# Altium footprint library Reflow3D1411sep.PcbLib: 657 footprints (part 41 of 42)
Each footprint in its own frame and in the unit in brackets; x right, y up, seen from the top. Pads: shape width x height; smd on the part's side, far side on the other; paste and mask are expansions set on the pad; w line width, h text height; cw(c..) or ccw(c..) is an arc to the next point about the centre after c.
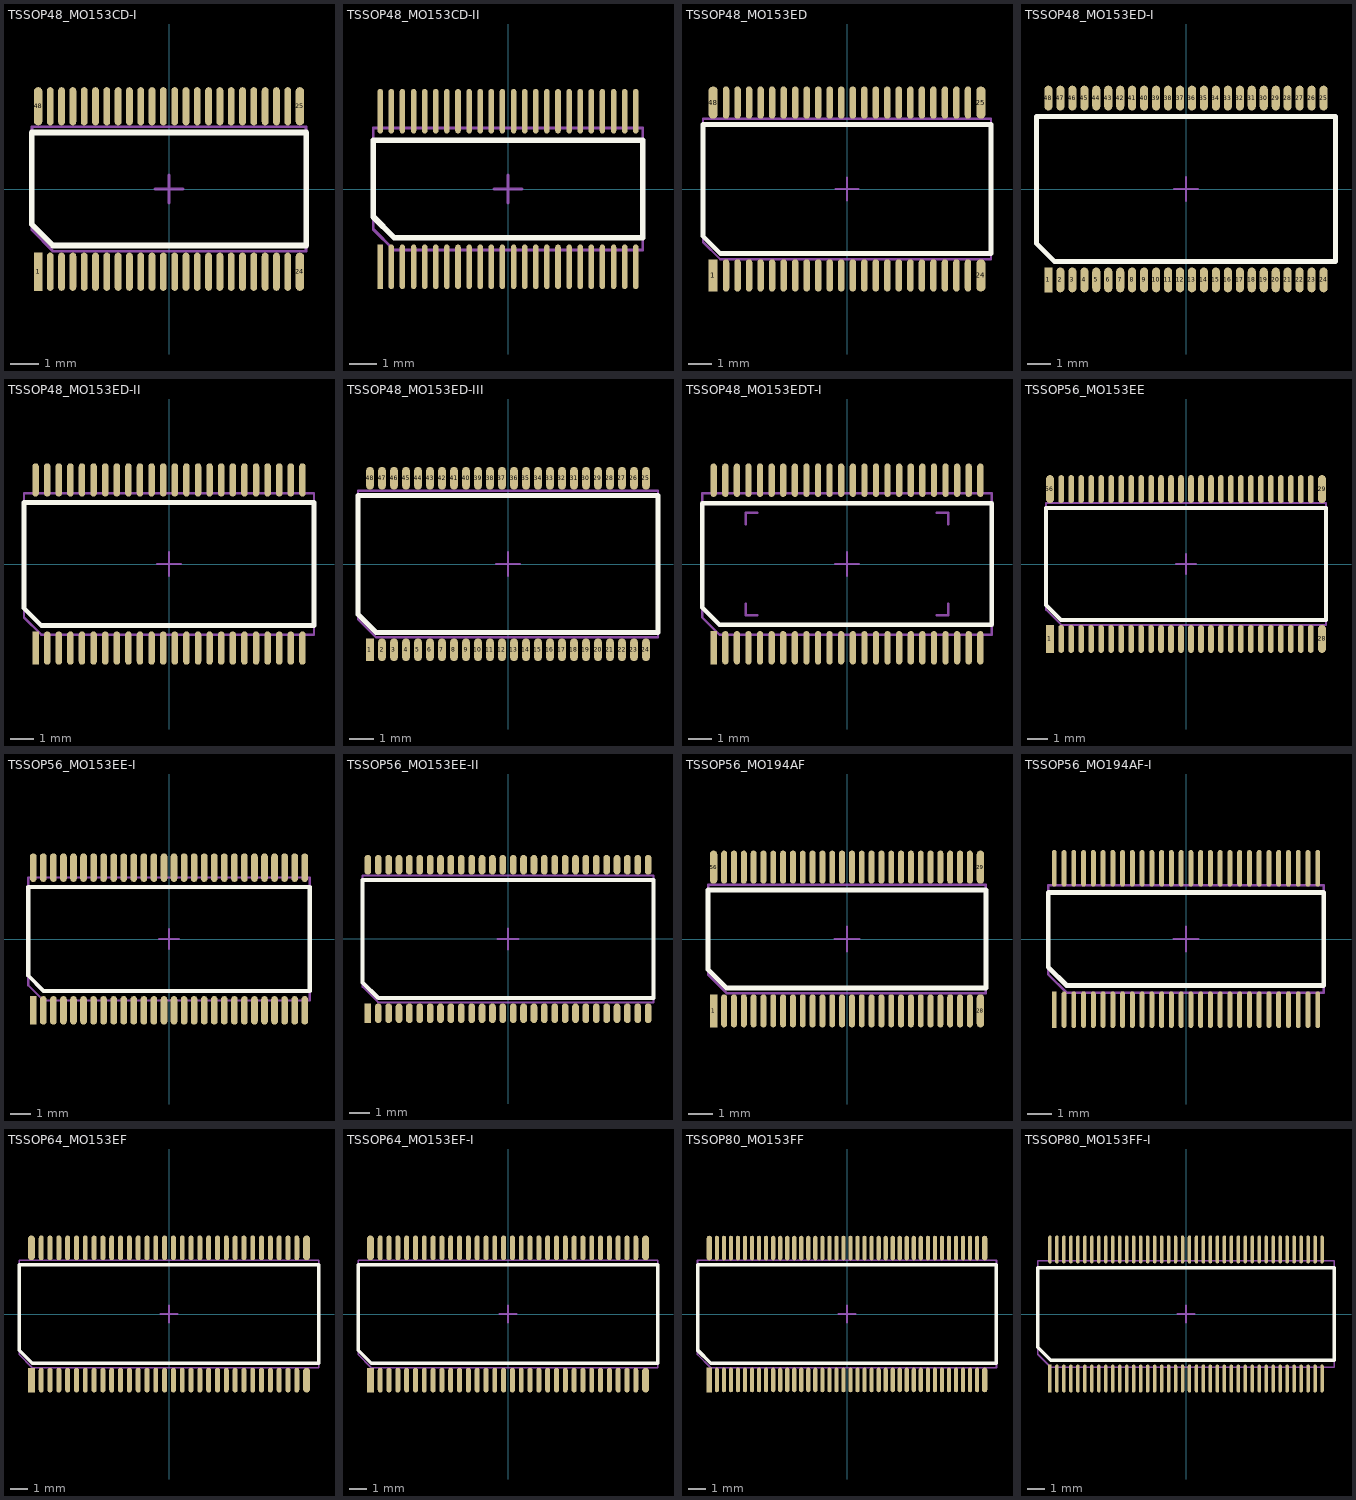
[diagram p40: the footprints below, top view; thin cyan lines are the x and y axes]

## TSSOP48_MO153CD-I [mm] "www.cypress.com, 51-85145.pdf; www.nxp.com, sot480-1_fr.pdf; www.jedec.org, MO-153f.pdf"
height 1.1
pads (48):
  rect 0.3x1.35 smd mask+0.085: 1(-4.63,-2.925)
  oval 0.24x1.35 smd mask+0.085: 2(-4.2,-2.925) 3(-3.8,-2.925) 4(-3.4,-2.925) 5(-3,-2.925) 6(-2.6,-2.925) 7(-2.2,-2.925) 8(-1.8,-2.925) 9(-1.4,-2.925) 10(-1,-2.925) 11(-0.6,-2.925) 12(-0.2,-2.925) 13(0.2,-2.925) 14(0.6,-2.925) 15(1,-2.925) 16(1.4,-2.925) 17(1.8,-2.925) 18(2.2,-2.925) 19(2.6,-2.925) 20(3,-2.925) 21(3.4,-2.925) 22(3.8,-2.925) 23(4.2,-2.925) 26(4.2,2.925) 27(3.8,2.925) 28(3.4,2.925) 29(3,2.925) 30(2.6,2.925) 31(2.2,2.925) 32(1.8,2.925) 33(1.4,2.925) 34(1,2.925) 35(0.6,2.925) 36(0.2,2.925) 37(-0.2,2.925) 38(-0.6,2.925) 39(-1,2.925) 40(-1.4,2.925) 41(-1.8,2.925) 42(-2.2,2.925) 43(-2.6,2.925) 44(-3,2.925) 45(-3.4,2.925) 46(-3.8,2.925) 47(-4.2,2.925)
  oval 0.3x1.35 smd mask+0.085: 24(4.63,-2.925) 25(4.63,2.925) 48(-4.63,2.925)
Top Overlay:
  lines w0.2: -4.85,-1.25 -4.85,2 4.85,2 4.85,-2 -4.1,-2 -4.85,-1.25
Mechanical 13:
  lines w0.1: -4.85,-1.45 -4.85,2.2 4.85,2.2 4.85,-2.2 -4.1,-2.2 -4.85,-1.45
Mechanical 15:
  lines w0.1: -0.5,0 0.5,0 ; 0,-0.5 0,0.5
3D body: height 1.2, standoff 0, extent -4.9,-2.25 4.9,2.25

## TSSOP48_MO153CD-II [mm] "www.ti.com, mpds006c.pdf, DGV48.asc"
height 1.1
pads (48):
  rect 0.2x1.6 smd mask+0.05: 1(-4.6,-2.8)
  oval 0.2x1.6 smd mask+0.05: 2(-4.2,-2.8) 3(-3.8,-2.8) 4(-3.4,-2.8) 5(-3,-2.8) 6(-2.6,-2.8) 7(-2.2,-2.8) 8(-1.8,-2.8) 9(-1.4,-2.8) 10(-1,-2.8) 11(-0.6,-2.8) 12(-0.2,-2.8) 13(0.2,-2.8) 14(0.6,-2.8) 15(1,-2.8) 16(1.4,-2.8) 17(1.8,-2.8) 18(2.2,-2.8) 19(2.6,-2.8) 20(3,-2.8) 21(3.4,-2.8) 22(3.8,-2.8) 23(4.2,-2.8) 24(4.6,-2.8) 25(4.6,2.8) 26(4.2,2.8) 27(3.8,2.8) 28(3.4,2.8) 29(3,2.8) 30(2.6,2.8) 31(2.2,2.8) 32(1.8,2.8) 33(1.4,2.8) 34(1,2.8) 35(0.6,2.8) 36(0.2,2.8) 37(-0.2,2.8) 38(-0.6,2.8) 39(-1,2.8) 40(-1.4,2.8) 41(-1.8,2.8) 42(-2.2,2.8) 43(-2.6,2.8) 44(-3,2.8) 45(-3.4,2.8) 46(-3.8,2.8) 47(-4.2,2.8) 48(-4.6,2.8)
Top Overlay:
  lines w0.2: -4.85,-1 -4.85,1.75 4.85,1.75 4.85,-1.75 -4.1,-1.75 -4.85,-1
Mechanical 13:
  lines w0.1: -4.85,-1.45 -4.85,2.2 4.85,2.2 4.85,-2.2 -4.1,-2.2 -4.85,-1.45
Mechanical 15:
  lines w0.1: -0.5,0 0.5,0 ; 0,-0.5 0,0.5
3D body: height 1.2, standoff 0, extent -4.9,-2.25 4.9,2.25

## TSSOP48_MO153ED [mm] "www.nxp.com, sot362-1_po.pdf, sot362-1_fr.pdf"
height 1.05
pads (48):
  rect 0.4x1.4 smd mask+0.05: 1(-5.81,-3.75)
  oval 0.28x1.4 smd mask+0.05: 2(-5.25,-3.75) 3(-4.75,-3.75) 4(-4.25,-3.75) 5(-3.75,-3.75) 6(-3.25,-3.75) 7(-2.75,-3.75) 8(-2.25,-3.75) 9(-1.75,-3.75) 10(-1.25,-3.75) 11(-0.75,-3.75) 12(-0.25,-3.75) 13(0.25,-3.75) 14(0.75,-3.75) 15(1.25,-3.75) 16(1.75,-3.75) 17(2.25,-3.75) 18(2.75,-3.75) 19(3.25,-3.75) 20(3.75,-3.75) 21(4.25,-3.75) 22(4.75,-3.75) 23(5.25,-3.75) 26(5.25,3.75) 27(4.75,3.75) 28(4.25,3.75) 29(3.75,3.75) 30(3.25,3.75) 31(2.75,3.75) 32(2.25,3.75) 33(1.75,3.75) 34(1.25,3.75) 35(0.75,3.75) 36(0.25,3.75) 37(-0.25,3.75) 38(-0.75,3.75) 39(-1.25,3.75) 40(-1.75,3.75) 41(-2.25,3.75) 42(-2.75,3.75) 43(-3.25,3.75) 44(-3.75,3.75) 45(-4.25,3.75) 46(-4.75,3.75) 47(-5.25,3.75)
  oval 0.4x1.4 smd mask+0.05: 24(5.81,-3.75) 25(5.81,3.75) 48(-5.81,3.75)
Top Overlay:
  lines w0.2: -6.25,-2.05 -5.5,-2.8 6.25,-2.8 6.25,2.8 -6.25,2.8 -6.25,-2.05
Mechanical 13:
  lines w0.1: -6.25,-2.3 -6.25,3.05 6.25,3.05 6.25,-3.05 -5.5,-3.05 -6.25,-2.3
Mechanical 15:
  lines w0.1: -0.5,0 0.5,0 ; 0,-0.5 0,0.5
3D body: height 1.2, standoff 0, extent -6.3,-3.1 6.3,3.1

## TSSOP48_MO153ED-I [mm] "www.analog.com, 59272155RV_48.pdf, 166876157rv_48.pdf; www.jedec.org, MO-153f.pdf"
height 1.1
pads (48):
  rect 0.34x1.04 smd mask+0.085: 1(-5.75,-3.8)
  oval 0.34x1.04 smd mask+0.085: 2(-5.25,-3.8) 3(-4.75,-3.8) 4(-4.25,-3.8) 5(-3.75,-3.8) 6(-3.25,-3.8) 7(-2.75,-3.8) 8(-2.25,-3.8) 9(-1.75,-3.8) 10(-1.25,-3.8) 11(-0.75,-3.8) 12(-0.25,-3.8) 13(0.25,-3.8) 14(0.75,-3.8) 15(1.25,-3.8) 16(1.75,-3.8) 17(2.25,-3.8) 18(2.75,-3.8) 19(3.25,-3.8) 20(3.75,-3.8) 21(4.25,-3.8) 22(4.75,-3.8) 23(5.25,-3.8) 24(5.75,-3.8) 25(5.75,3.8) 26(5.25,3.8) 27(4.75,3.8) 28(4.25,3.8) 29(3.75,3.8) 30(3.25,3.8) 31(2.75,3.8) 32(2.25,3.8) 33(1.75,3.8) 34(1.25,3.8) 35(0.75,3.8) 36(0.25,3.8) 37(-0.25,3.8) 38(-0.75,3.8) 39(-1.25,3.8) 40(-1.75,3.8) 41(-2.25,3.8) 42(-2.75,3.8) 43(-3.25,3.8) 44(-3.75,3.8) 45(-4.25,3.8) 46(-4.75,3.8) 47(-5.25,3.8) 48(-5.75,3.8)
Top Overlay:
  lines w0.2: -6.25,-2.275 -5.5,-3.025 6.25,-3.025 6.25,3.025 -6.25,3.025 -6.25,-2.275
Mechanical 13:
  lines w0.1: -6.25,-2.3 -6.25,3.05 6.25,3.05 6.25,-3.05 -5.5,-3.05 -6.25,-2.3
Mechanical 15:
  lines w0.1: -0.5,0 0.5,0 ; 0,-0.5 0,0.5
3D body: height 1.2, standoff 0, extent -6.3,-3.1 6.3,3.1

## TSSOP48_MO153ED-II [mm] "www.maxim-ic.com, 21-0155.PDF, 90-0124.PDF"
height 1
pads (48):
  rect 0.28x1.43 smd mask+0.05: 1(-5.75,-3.625)
  oval 0.28x1.43 smd mask+0.05: 2(-5.25,-3.625) 3(-4.75,-3.625) 4(-4.25,-3.625) 5(-3.75,-3.625) 6(-3.25,-3.625) 7(-2.75,-3.625) 8(-2.25,-3.625) 9(-1.75,-3.625) 10(-1.25,-3.625) 11(-0.75,-3.625) 12(-0.25,-3.625) 13(0.25,-3.625) 14(0.75,-3.625) 15(1.25,-3.625) 16(1.75,-3.625) 17(2.25,-3.625) 18(2.75,-3.625) 19(3.25,-3.625) 20(3.75,-3.625) 21(4.25,-3.625) 22(4.75,-3.625) 23(5.25,-3.625) 24(5.75,-3.625) 25(5.75,3.625) 26(5.25,3.625) 27(4.75,3.625) 28(4.25,3.625) 29(3.75,3.625) 30(3.25,3.625) 31(2.75,3.625) 32(2.25,3.625) 33(1.75,3.625) 34(1.25,3.625) 35(0.75,3.625) 36(0.25,3.625) 37(-0.25,3.625) 38(-0.75,3.625) 39(-1.25,3.625) 40(-1.75,3.625) 41(-2.25,3.625) 42(-2.75,3.625) 43(-3.25,3.625) 44(-3.75,3.625) 45(-4.25,3.625) 46(-4.75,3.625) 47(-5.25,3.625) 48(-5.75,3.625)
Top Overlay:
  lines w0.2: -6.25,-1.9 -6.25,2.65 6.25,2.65 6.25,-2.65 -5.5,-2.65 -6.25,-1.9
Mechanical 13:
  lines w0.1: -6.25,-2.3 -6.25,3.05 6.25,3.05 6.25,-3.05 -5.5,-3.05 -6.25,-2.3
Mechanical 15:
  lines w0.1: -0.5,0 0.5,0 ; 0,-0.5 0,0.5
3D body: height 1.1, standoff 0, extent -6.3,-3.1 6.3,3.1

## TSSOP48_MO153ED-III [mm] "www.linear.com, TSSOP_48_05-08-1651.pdf"
height 1
pads (48):
  rect 0.32x0.95 smd mask+0.075: 1(-5.75,-3.575)
  oval 0.32x0.95 smd mask+0.075: 2(-5.25,-3.575) 3(-4.75,-3.575) 4(-4.25,-3.575) 5(-3.75,-3.575) 6(-3.25,-3.575) 7(-2.75,-3.575) 8(-2.25,-3.575) 9(-1.75,-3.575) 10(-1.25,-3.575) 11(-0.75,-3.575) 12(-0.25,-3.575) 13(0.25,-3.575) 14(0.75,-3.575) 15(1.25,-3.575) 16(1.75,-3.575) 17(2.25,-3.575) 18(2.75,-3.575) 19(3.25,-3.575) 20(3.75,-3.575) 21(4.25,-3.575) 22(4.75,-3.575) 23(5.25,-3.575) 24(5.75,-3.575) 25(5.75,3.575) 26(5.25,3.575) 27(4.75,3.575) 28(4.25,3.575) 29(3.75,3.575) 30(3.25,3.575) 31(2.75,3.575) 32(2.25,3.575) 33(1.75,3.575) 34(1.25,3.575) 35(0.75,3.575) 36(0.25,3.575) 37(-0.25,3.575) 38(-0.75,3.575) 39(-1.25,3.575) 40(-1.75,3.575) 41(-2.25,3.575) 42(-2.75,3.575) 43(-3.25,3.575) 44(-3.75,3.575) 45(-4.25,3.575) 46(-4.75,3.575) 47(-5.25,3.575) 48(-5.75,3.575)
Top Overlay:
  lines w0.2: -6.25,-2.1 -6.25,2.85 6.25,2.85 6.25,-2.85 -5.5,-2.85 -6.25,-2.1
Top Solder:
  drawing of 46 lines, arcs and shapes, not listed
Mechanical 13:
  lines w0.1: -6.25,-2.3 -6.25,3.05 6.25,3.05 6.25,-3.05 -5.5,-3.05 -6.25,-2.3
Mechanical 15:
  lines w0.1: -0.5,0 0.5,0 ; 0,-0.5 0,0.5
3D body: height 1.1, standoff 0, extent -6.3,-3.1 6.3,3.1

## TSSOP48_MO153EDT-I [mm] "www.maxim-ic.com, 21-0444.PDF, 90-0273.PDF"
height 1.05
pads (48):
  rect 0.27x1.44 smd mask+0.05: 1(-5.75,-3.615)
  oval 0.27x1.44 smd mask+0.05: 2(-5.25,-3.615) 3(-4.75,-3.615) 4(-4.25,-3.615) 5(-3.75,-3.615) 6(-3.25,-3.615) 7(-2.75,-3.615) 8(-2.25,-3.615) 9(-1.75,-3.615) 10(-1.25,-3.615) 11(-0.75,-3.615) 12(-0.25,-3.615) 13(0.25,-3.615) 14(0.75,-3.615) 15(1.25,-3.615) 16(1.75,-3.615) 17(2.25,-3.615) 18(2.75,-3.615) 19(3.25,-3.615) 20(3.75,-3.615) 21(4.25,-3.615) 22(4.75,-3.615) 23(5.25,-3.615) 24(5.75,-3.615) 25(5.75,3.615) 26(5.25,3.615) 27(4.75,3.615) 28(4.25,3.615) 29(3.75,3.615) 30(3.25,3.615) 31(2.75,3.615) 32(2.25,3.615) 33(1.75,3.615) 34(1.25,3.615) 35(0.75,3.615) 36(0.25,3.615) 37(-0.25,3.615) 38(-0.75,3.615) 39(-1.25,3.615) 40(-1.75,3.615) 41(-2.25,3.615) 42(-2.75,3.615) 43(-3.25,3.615) 44(-3.75,3.615) 45(-4.25,3.615) 46(-4.75,3.615) 47(-5.25,3.615) 48(-5.75,3.615)
Top Overlay:
  lines w0.2: -6.25,-1.875 -6.25,2.625 6.25,2.625 6.25,-2.625 -5.5,-2.625 -6.25,-1.875
Mechanical 13:
  lines w0.1: -4.37,-1.71 -4.37,-2.21 -3.87,-2.21 ; -4.37,1.71 -4.37,2.21 -3.87,2.21 ; 3.87,-2.21 4.37,-2.21 4.37,-1.71 ; 3.87,2.21 4.37,2.21 4.37,1.71 ; -6.25,-2.3 -6.25,3.05 6.25,3.05 6.25,-3.05 -5.5,-3.05 -6.25,-2.3
Mechanical 15:
  lines w0.1: -0.5,0 0.5,0 ; 0,-0.5 0,0.5
3D body: height 1.1, standoff 0, extent -6.3,-3.1 6.3,3.1

## TSSOP56_MO153EE [mm] "www.nxp.com, sot364-1.pdf, SOT364-1_fp-reflow.pdf"
height 1.05
pads (56):
  rect 0.4x1.4 smd mask+0.05: 1(-6.81,-3.75)
  oval 0.28x1.4 smd mask+0.05: 2(-6.25,-3.75) 3(-5.75,-3.75) 4(-5.25,-3.75) 5(-4.75,-3.75) 6(-4.25,-3.75) 7(-3.75,-3.75) 8(-3.25,-3.75) 9(-2.75,-3.75) 10(-2.25,-3.75) 11(-1.75,-3.75) 12(-1.25,-3.75) 13(-0.75,-3.75) 14(-0.25,-3.75) 15(0.25,-3.75) 16(0.75,-3.75) 17(1.25,-3.75) 18(1.75,-3.75) 19(2.25,-3.75) 20(2.75,-3.75) 21(3.25,-3.75) 22(3.75,-3.75) 23(4.25,-3.75) 24(4.75,-3.75) 25(5.25,-3.75) 26(5.75,-3.75) 27(6.25,-3.75) 30(6.25,3.75) 31(5.75,3.75) 32(5.25,3.75) 33(4.75,3.75) 34(4.25,3.75) 35(3.75,3.75) 36(3.25,3.75) 37(2.75,3.75) 38(2.25,3.75) 39(1.75,3.75) 40(1.25,3.75) 41(0.75,3.75) 42(0.25,3.75) 43(-0.25,3.75) 44(-0.75,3.75) 45(-1.25,3.75) 46(-1.75,3.75) 47(-2.25,3.75) 48(-2.75,3.75) 49(-3.25,3.75) 50(-3.75,3.75) 51(-4.25,3.75) 52(-4.75,3.75) 53(-5.25,3.75) 54(-5.75,3.75) 55(-6.25,3.75)
  oval 0.4x1.4 smd mask+0.05: 28(6.81,-3.75) 29(6.81,3.75) 56(-6.81,3.75)
Top Overlay:
  lines w0.2: -7,-2.05 -7,2.8 7,2.8 7,-2.8 -6.25,-2.8 -7,-2.05
Mechanical 13:
  lines w0.1: -7,-2.3 -7,3.05 7,3.05 7,-3.05 -6.25,-3.05 -7,-2.3
Mechanical 15:
  lines w0.1: -0.5,0 0.5,0 ; 0,-0.5 0,0.5
3D body: height 1.2, standoff 0, extent -7.05,-3.1 7.05,3.1

## TSSOP56_MO153EE-I [mm] "www.maxim-ic.com, 21-0481.PDF, 90-0338.PDF; www.jedec.org, MO-153f.pdf"
height 1.1
pads (56):
  rect 0.33x1.42 smd mask+0.085: 1(-6.75,-3.55)
  oval 0.33x1.42 smd mask+0.085: 2(-6.25,-3.55) 3(-5.75,-3.55) 4(-5.25,-3.55) 5(-4.75,-3.55) 6(-4.25,-3.55) 7(-3.75,-3.55) 8(-3.25,-3.55) 9(-2.75,-3.55) 10(-2.25,-3.55) 11(-1.75,-3.55) 12(-1.25,-3.55) 13(-0.75,-3.55) 14(-0.25,-3.55) 15(0.25,-3.55) 16(0.75,-3.55) 17(1.25,-3.55) 18(1.75,-3.55) 19(2.25,-3.55) 20(2.75,-3.55) 21(3.25,-3.55) 22(3.75,-3.55) 23(4.25,-3.55) 24(4.75,-3.55) 25(5.25,-3.55) 26(5.75,-3.55) 27(6.25,-3.55) 28(6.75,-3.55) 29(6.75,3.55) 30(6.25,3.55) 31(5.75,3.55) 32(5.25,3.55) 33(4.75,3.55) 34(4.25,3.55) 35(3.75,3.55) 36(3.25,3.55) 37(2.75,3.55) 38(2.25,3.55) 39(1.75,3.55) 40(1.25,3.55) 41(0.75,3.55) 42(0.25,3.55) 43(-0.25,3.55) 44(-0.75,3.55) 45(-1.25,3.55) 46(-1.75,3.55) 47(-2.25,3.55) 48(-2.75,3.55) 49(-3.25,3.55) 50(-3.75,3.55) 51(-4.25,3.55) 52(-4.75,3.55) 53(-5.25,3.55) 54(-5.75,3.55) 55(-6.25,3.55) 56(-6.75,3.55)
Top Overlay:
  lines w0.2: -7,-1.825 -6.25,-2.575 7,-2.575 7,2.575 -7,2.575 -7,-1.825
Mechanical 13:
  lines w0.1: -7,-2.3 -6.25,-3.05 7,-3.05 7,3.05 -7,3.05 -7,-2.3
Mechanical 15:
  lines w0.1: -0.5,0 0.5,0 ; 0,-0.5 0,0.5
3D body: height 1.2, standoff 0, extent -7.05,-3.1 7.05,3.1

## TSSOP56_MO153EE-II [mm] "www.linear.com, TSSOP_56_05-08-1652.pdf"
height 1
pads (56):
  rect 0.32x0.95 smd mask+0.075: 1(-6.75,-3.575)
  oval 0.32x0.95 smd mask+0.075: 2(-6.25,-3.575) 3(-5.75,-3.575) 4(-5.25,-3.575) 5(-4.75,-3.575) 6(-4.25,-3.575) 7(-3.75,-3.575) 8(-3.25,-3.575) 9(-2.75,-3.575) 10(-2.25,-3.575) 11(-1.75,-3.575) 12(-1.25,-3.575) 13(-0.75,-3.575) 14(-0.25,-3.575) 15(0.25,-3.575) 16(0.75,-3.575) 17(1.25,-3.575) 18(1.75,-3.575) 19(2.25,-3.575) 20(2.75,-3.575) 21(3.25,-3.575) 22(3.75,-3.575) 23(4.25,-3.575) 24(4.75,-3.575) 25(5.25,-3.575) 26(5.75,-3.575) 27(6.25,-3.575) 28(6.75,-3.575) 29(6.75,3.575) 30(6.25,3.575) 31(5.75,3.575) 32(5.25,3.575) 33(4.75,3.575) 34(4.25,3.575) 35(3.75,3.575) 36(3.25,3.575) 37(2.75,3.575) 38(2.25,3.575) 39(1.75,3.575) 40(1.25,3.575) 41(0.75,3.575) 42(0.25,3.575) 43(-0.25,3.575) 44(-0.75,3.575) 45(-1.25,3.575) 46(-1.75,3.575) 47(-2.25,3.575) 48(-2.75,3.575) 49(-3.25,3.575) 50(-3.75,3.575) 51(-4.25,3.575) 52(-4.75,3.575) 53(-5.25,3.575) 54(-5.75,3.575) 55(-6.25,3.575) 56(-6.75,3.575)
Top Overlay:
  lines w0.2: -7,-2.1 -7,2.85 7,2.85 7,-2.85 -6.25,-2.85 -7,-2.1
Top Solder:
  drawing of 54 lines, arcs and shapes, not listed
Mechanical 13:
  lines w0.1: -7,-2.3 -7,3.05 7,3.05 7,-3.05 -6.25,-3.05 -7,-2.3
Mechanical 15:
  lines w0.1: -0.5,0 0.5,0 ; 0,-0.5 0,0.5
3D body: height 1.1, standoff 0, extent -7.05,-3.1 7.05,3.1

## TSSOP56_MO194AF [mm] "www.nxp.com, sot481-2_po.pdf, sot481-2_fr.pdf; www.jedec.org, mo-194b.pdf"
height 1.1
pads (56):
  rect 0.3x1.35 smd mask+0.085: 1(-5.43,-2.925)
  oval 0.24x1.35 smd mask+0.085: 2(-5,-2.925) 3(-4.6,-2.925) 4(-4.2,-2.925) 5(-3.8,-2.925) 6(-3.4,-2.925) 7(-3,-2.925) 8(-2.6,-2.925) 9(-2.2,-2.925) 10(-1.8,-2.925) 11(-1.4,-2.925) 12(-1,-2.925) 13(-0.6,-2.925) 14(-0.2,-2.925) 15(0.2,-2.925) 16(0.6,-2.925) 17(1,-2.925) 18(1.4,-2.925) 19(1.8,-2.925) 20(2.2,-2.925) 21(2.6,-2.925) 22(3,-2.925) 23(3.4,-2.925) 24(3.8,-2.925) 25(4.2,-2.925) 26(4.6,-2.925) 27(5,-2.925) 30(5,2.925) 31(4.6,2.925) 32(4.2,2.925) 33(3.8,2.925) 34(3.4,2.925) 35(3,2.925) 36(2.6,2.925) 37(2.2,2.925) 38(1.8,2.925) 39(1.4,2.925) 40(1,2.925) 41(0.6,2.925) 42(0.2,2.925) 43(-0.2,2.925) 44(-0.6,2.925) 45(-1,2.925) 46(-1.4,2.925) 47(-1.8,2.925) 48(-2.2,2.925) 49(-2.6,2.925) 50(-3,2.925) 51(-3.4,2.925) 52(-3.8,2.925) 53(-4.2,2.925) 54(-4.6,2.925) 55(-5,2.925)
  oval 0.3x1.35 smd mask+0.085: 28(5.43,-2.925) 29(5.43,2.925) 56(-5.43,2.925)
Top Overlay:
  lines w0.2: -5.65,-1.25 -5.65,2 5.65,2 5.65,-2 -4.9,-2 -5.65,-1.25
Mechanical 13:
  lines w0.1: -5.65,-1.45 -5.65,2.2 5.65,2.2 5.65,-2.2 -4.9,-2.2 -5.65,-1.45
Mechanical 15:
  lines w0.1: -0.5,0 0.5,0 ; 0,-0.5 0,0.5
3D body: height 1.2, standoff 0, extent -5.7,-2.25 5.7,2.25

## TSSOP56_MO194AF-I [mm] "www.idt.com, PSC4055.pdf; www.jedec.org, mo-194b.pdf"
height 1.1
pads (56):
  rect 0.2x1.5 smd mask+0.05: 1(-5.4,-2.9)
  oval 0.2x1.5 smd mask+0.05: 2(-5,-2.9) 3(-4.6,-2.9) 4(-4.2,-2.9) 5(-3.8,-2.9) 6(-3.4,-2.9) 7(-3,-2.9) 8(-2.6,-2.9) 9(-2.2,-2.9) 10(-1.8,-2.9) 11(-1.4,-2.9) 12(-1,-2.9) 13(-0.6,-2.9) 14(-0.2,-2.9) 15(0.2,-2.9) 16(0.6,-2.9) 17(1,-2.9) 18(1.4,-2.9) 19(1.8,-2.9) 20(2.2,-2.9) 21(2.6,-2.9) 22(3,-2.9) 23(3.4,-2.9) 24(3.8,-2.9) 25(4.2,-2.9) 26(4.6,-2.9) 27(5,-2.9) 28(5.4,-2.9) 29(5.4,2.9) 30(5,2.9) 31(4.6,2.9) 32(4.2,2.9) 33(3.8,2.9) 34(3.4,2.9) 35(3,2.9) 36(2.6,2.9) 37(2.2,2.9) 38(1.8,2.9) 39(1.4,2.9) 40(1,2.9) 41(0.6,2.9) 42(0.2,2.9) 43(-0.2,2.9) 44(-0.6,2.9) 45(-1,2.9) 46(-1.4,2.9) 47(-1.8,2.9) 48(-2.2,2.9) 49(-2.6,2.9) 50(-3,2.9) 51(-3.4,2.9) 52(-3.8,2.9) 53(-4.2,2.9) 54(-4.6,2.9) 55(-5,2.9) 56(-5.4,2.9)
Top Overlay:
  lines w0.2: -5.65,-1.15 -4.9,-1.9 5.65,-1.9 5.65,1.9 -5.65,1.9 -5.65,-1.15
Mechanical 13:
  lines w0.1: -5.65,-1.45 -5.65,2.2 5.65,2.2 5.65,-2.2 -4.9,-2.2 -5.65,-1.45
Mechanical 15:
  lines w0.1: -0.5,0 0.5,0 ; 0,-0.5 0,0.5
3D body: height 1.2, standoff 0, extent -5.7,-2.25 5.7,2.25

## TSSOP64_MO153EF [mm] "www.nxp.com, sot646-1_po.pdf, sot646-1_fr.pdf; www.jedec.org, MO-153f.pdf"
height 1.1
pads (64):
  rect 0.4x1.4 smd mask+0.05: 1(-7.81,-3.75)
  oval 0.28x1.4 smd mask+0.05: 2(-7.25,-3.75) 3(-6.75,-3.75) 4(-6.25,-3.75) 5(-5.75,-3.75) 6(-5.25,-3.75) 7(-4.75,-3.75) 8(-4.25,-3.75) 9(-3.75,-3.75) 10(-3.25,-3.75) 11(-2.75,-3.75) 12(-2.25,-3.75) 13(-1.75,-3.75) 14(-1.25,-3.75) 15(-0.75,-3.75) 16(-0.25,-3.75) 17(0.25,-3.75) 18(0.75,-3.75) 19(1.25,-3.75) 20(1.75,-3.75) 21(2.25,-3.75) 22(2.75,-3.75) 23(3.25,-3.75) 24(3.75,-3.75) 25(4.25,-3.75) 26(4.75,-3.75) 27(5.25,-3.75) 28(5.75,-3.75) 29(6.25,-3.75) 30(6.75,-3.75) 31(7.25,-3.75) 34(7.25,3.75) 35(6.75,3.75) 36(6.25,3.75) 37(5.75,3.75) 38(5.25,3.75) 39(4.75,3.75) 40(4.25,3.75) 41(3.75,3.75) 42(3.25,3.75) 43(2.75,3.75) 44(2.25,3.75) 45(1.75,3.75) 46(1.25,3.75) 47(0.75,3.75) 48(0.25,3.75) 49(-0.25,3.75) 50(-0.75,3.75) 51(-1.25,3.75) 52(-1.75,3.75) 53(-2.25,3.75) 54(-2.75,3.75) 55(-3.25,3.75) 56(-3.75,3.75) 57(-4.25,3.75) 58(-4.75,3.75) 59(-5.25,3.75) 60(-5.75,3.75) 61(-6.25,3.75) 62(-6.75,3.75) 63(-7.25,3.75)
  oval 0.4x1.4 smd mask+0.05: 32(7.81,-3.75) 33(7.81,3.75) 64(-7.81,3.75)
Top Overlay:
  lines w0.2: -8.5,-2.05 -7.75,-2.8 8.5,-2.8 8.5,2.8 -8.5,2.8 -8.5,-2.05
Mechanical 13:
  lines w0.1: -8.5,-2.3 -7.75,-3.05 8.5,-3.05 8.5,3.05 -8.5,3.05 -8.5,-2.3
Mechanical 15:
  lines w0.1: -0.5,0 0.5,0 ; 0,-0.5 0,0.5
3D body: height 1.2, standoff 0, extent -8.55,-3.1 8.55,3.1

## TSSOP64_MO153EF-I [mm] "www.cypress.com, 51-85153.pdf; www.nxp.com, sot646-1_fr.pdf"
height 1
pads (64):
  rect 0.4x1.4 smd mask+0.05: 1(-7.81,-3.75)
  oval 0.28x1.4 smd mask+0.05: 2(-7.25,-3.75) 3(-6.75,-3.75) 4(-6.25,-3.75) 5(-5.75,-3.75) 6(-5.25,-3.75) 7(-4.75,-3.75) 8(-4.25,-3.75) 9(-3.75,-3.75) 10(-3.25,-3.75) 11(-2.75,-3.75) 12(-2.25,-3.75) 13(-1.75,-3.75) 14(-1.25,-3.75) 15(-0.75,-3.75) 16(-0.25,-3.75) 17(0.25,-3.75) 18(0.75,-3.75) 19(1.25,-3.75) 20(1.75,-3.75) 21(2.25,-3.75) 22(2.75,-3.75) 23(3.25,-3.75) 24(3.75,-3.75) 25(4.25,-3.75) 26(4.75,-3.75) 27(5.25,-3.75) 28(5.75,-3.75) 29(6.25,-3.75) 30(6.75,-3.75) 31(7.25,-3.75) 34(7.25,3.75) 35(6.75,3.75) 36(6.25,3.75) 37(5.75,3.75) 38(5.25,3.75) 39(4.75,3.75) 40(4.25,3.75) 41(3.75,3.75) 42(3.25,3.75) 43(2.75,3.75) 44(2.25,3.75) 45(1.75,3.75) 46(1.25,3.75) 47(0.75,3.75) 48(0.25,3.75) 49(-0.25,3.75) 50(-0.75,3.75) 51(-1.25,3.75) 52(-1.75,3.75) 53(-2.25,3.75) 54(-2.75,3.75) 55(-3.25,3.75) 56(-3.75,3.75) 57(-4.25,3.75) 58(-4.75,3.75) 59(-5.25,3.75) 60(-5.75,3.75) 61(-6.25,3.75) 62(-6.75,3.75) 63(-7.25,3.75)
  oval 0.4x1.4 smd mask+0.05: 32(7.81,-3.75) 33(7.81,3.75) 64(-7.81,3.75)
Top Overlay:
  lines w0.2: -8.5,-2.05 -7.75,-2.8 8.5,-2.8 8.5,2.8 -8.5,2.8 -8.5,-2.05
Mechanical 13:
  lines w0.1: -8.5,-2.3 -7.75,-3.05 8.5,-3.05 8.5,3.05 -8.5,3.05 -8.5,-2.3
Mechanical 15:
  lines w0.1: -0.5,0 0.5,0 ; 0,-0.5 0,0.5
3D body: height 1.1, standoff 0, extent -8.55,-3.1 8.55,3.1

## TSSOP80_MO153FF [mm] "www.nxp.com, sot647-1_po.pdf, sot647-1_fr.pdf; www.jedec.org, MO-153f.pdf"
height 1.1
pads (80):
  rect 0.3x1.4 smd mask+0.085: 1(-7.83,-3.75)
  oval 0.24x1.4 smd mask+0.085: 2(-7.4,-3.75) 3(-7,-3.75) 4(-6.6,-3.75) 5(-6.2,-3.75) 6(-5.8,-3.75) 7(-5.4,-3.75) 8(-5,-3.75) 9(-4.6,-3.75) 10(-4.2,-3.75) 11(-3.8,-3.75) 12(-3.4,-3.75) 13(-3,-3.75) 14(-2.6,-3.75) 15(-2.2,-3.75) 16(-1.8,-3.75) 17(-1.4,-3.75) 18(-1,-3.75) 19(-0.6,-3.75) 20(-0.2,-3.75) 21(0.2,-3.75) 22(0.6,-3.75) 23(1,-3.75) 24(1.4,-3.75) 25(1.8,-3.75) 26(2.2,-3.75) 27(2.6,-3.75) 28(3,-3.75) 29(3.4,-3.75) 30(3.8,-3.75) 31(4.2,-3.75) 32(4.6,-3.75) 33(5,-3.75) 34(5.4,-3.75) 35(5.8,-3.75) 36(6.2,-3.75) 37(6.6,-3.75) 38(7,-3.75) 39(7.4,-3.75) 42(7.4,3.75) 43(7,3.75) 44(6.6,3.75) 45(6.2,3.75) 46(5.8,3.75) 47(5.4,3.75) 48(5,3.75) 49(4.6,3.75) 50(4.2,3.75) 51(3.8,3.75) 52(3.4,3.75) 53(3,3.75) 54(2.6,3.75) 55(2.2,3.75) 56(1.8,3.75) 57(1.4,3.75) 58(1,3.75) 59(0.6,3.75) 60(0.2,3.75) 61(-0.2,3.75) 62(-0.6,3.75) 63(-1,3.75) 64(-1.4,3.75) 65(-1.8,3.75) 66(-2.2,3.75) 67(-2.6,3.75) 68(-3,3.75) 69(-3.4,3.75) 70(-3.8,3.75) 71(-4.2,3.75) 72(-4.6,3.75) 73(-5,3.75) 74(-5.4,3.75) 75(-5.8,3.75) 76(-6.2,3.75) 77(-6.6,3.75) 78(-7,3.75) 79(-7.4,3.75)
  oval 0.3x1.4 smd mask+0.085: 40(7.83,-3.75) 41(7.83,3.75) 80(-7.83,3.75)
Top Overlay:
  lines w0.2: -8.5,-2.05 -7.75,-2.8 8.5,-2.8 8.5,2.8 -8.5,2.8 -8.5,-2.05
Mechanical 13:
  lines w0.1: -8.5,-2.3 -7.75,-3.05 8.5,-3.05 8.5,3.05 -8.5,3.05 -8.5,-2.3
Mechanical 15:
  lines w0.1: -0.5,0 0.5,0 ; 0,-0.5 0,0.5
3D body: height 1.2, standoff 0, extent -8.55,-3.1 8.55,3.1

## TSSOP80_MO153FF-I [mm] "www.ti.com, mtss005d.pdf, DBB80.asc; www.jedec.org, MO-153f.pdf"
height 1.1
pads (80):
  rect 0.2x1.6 smd mask+0.05: 1(-7.8,-3.7)
  oval 0.2x1.6 smd mask+0.05: 2(-7.4,-3.7) 3(-7,-3.7) 4(-6.6,-3.7) 5(-6.2,-3.7) 6(-5.8,-3.7) 7(-5.4,-3.7) 8(-5,-3.7) 9(-4.6,-3.7) 10(-4.2,-3.7) 11(-3.8,-3.7) 12(-3.4,-3.7) 13(-3,-3.7) 14(-2.6,-3.7) 15(-2.2,-3.7) 16(-1.8,-3.7) 17(-1.4,-3.7) 18(-1,-3.7) 19(-0.6,-3.7) 20(-0.2,-3.7) 21(0.2,-3.7) 22(0.6,-3.7) 23(1,-3.7) 24(1.4,-3.7) 25(1.8,-3.7) 26(2.2,-3.7) 27(2.6,-3.7) 28(3,-3.7) 29(3.4,-3.7) 30(3.8,-3.7) 31(4.2,-3.7) 32(4.6,-3.7) 33(5,-3.7) 34(5.4,-3.7) 35(5.8,-3.7) 36(6.2,-3.7) 37(6.6,-3.7) 38(7,-3.7) 39(7.4,-3.7) 40(7.8,-3.7) 41(7.8,3.7) 42(7.4,3.7) 43(7,3.7) 44(6.6,3.7) 45(6.2,3.7) 46(5.8,3.7) 47(5.4,3.7) 48(5,3.7) 49(4.6,3.7) 50(4.2,3.7) 51(3.8,3.7) 52(3.4,3.7) 53(3,3.7) 54(2.6,3.7) 55(2.2,3.7) 56(1.8,3.7) 57(1.4,3.7) 58(1,3.7) 59(0.6,3.7) 60(0.2,3.7) 61(-0.2,3.7) 62(-0.6,3.7) 63(-1,3.7) 64(-1.4,3.7) 65(-1.8,3.7) 66(-2.2,3.7) 67(-2.6,3.7) 68(-3,3.7) 69(-3.4,3.7) 70(-3.8,3.7) 71(-4.2,3.7) 72(-4.6,3.7) 73(-5,3.7) 74(-5.4,3.7) 75(-5.8,3.7) 76(-6.2,3.7) 77(-6.6,3.7) 78(-7,3.7) 79(-7.4,3.7) 80(-7.8,3.7)
Top Overlay:
  lines w0.2: -8.5,-1.9 -8.5,2.65 8.5,2.65 8.5,-2.65 -7.75,-2.65 -8.5,-1.9
Mechanical 13:
  lines w0.1: -8.5,-2.3 -8.5,3.05 8.5,3.05 8.5,-3.05 -7.75,-3.05 -8.5,-2.3
Mechanical 15:
  lines w0.1: -0.5,0 0.5,0 ; 0,-0.5 0,0.5
3D body: height 1.2, standoff 0, extent -8.55,-3.1 8.55,3.1